# Altium footprint library Ports2.54.PcbLib: 152 footprints (part 7 of 10)
Each footprint in its own frame and in the unit in brackets; x right, y up, seen from the top. Pads: shape width x height; smd on the part's side, far side on the other; paste and mask are expansions set on the pad; w line width, h text height; cw(c..) or ccw(c..) is an arc to the next point about the centre after c.
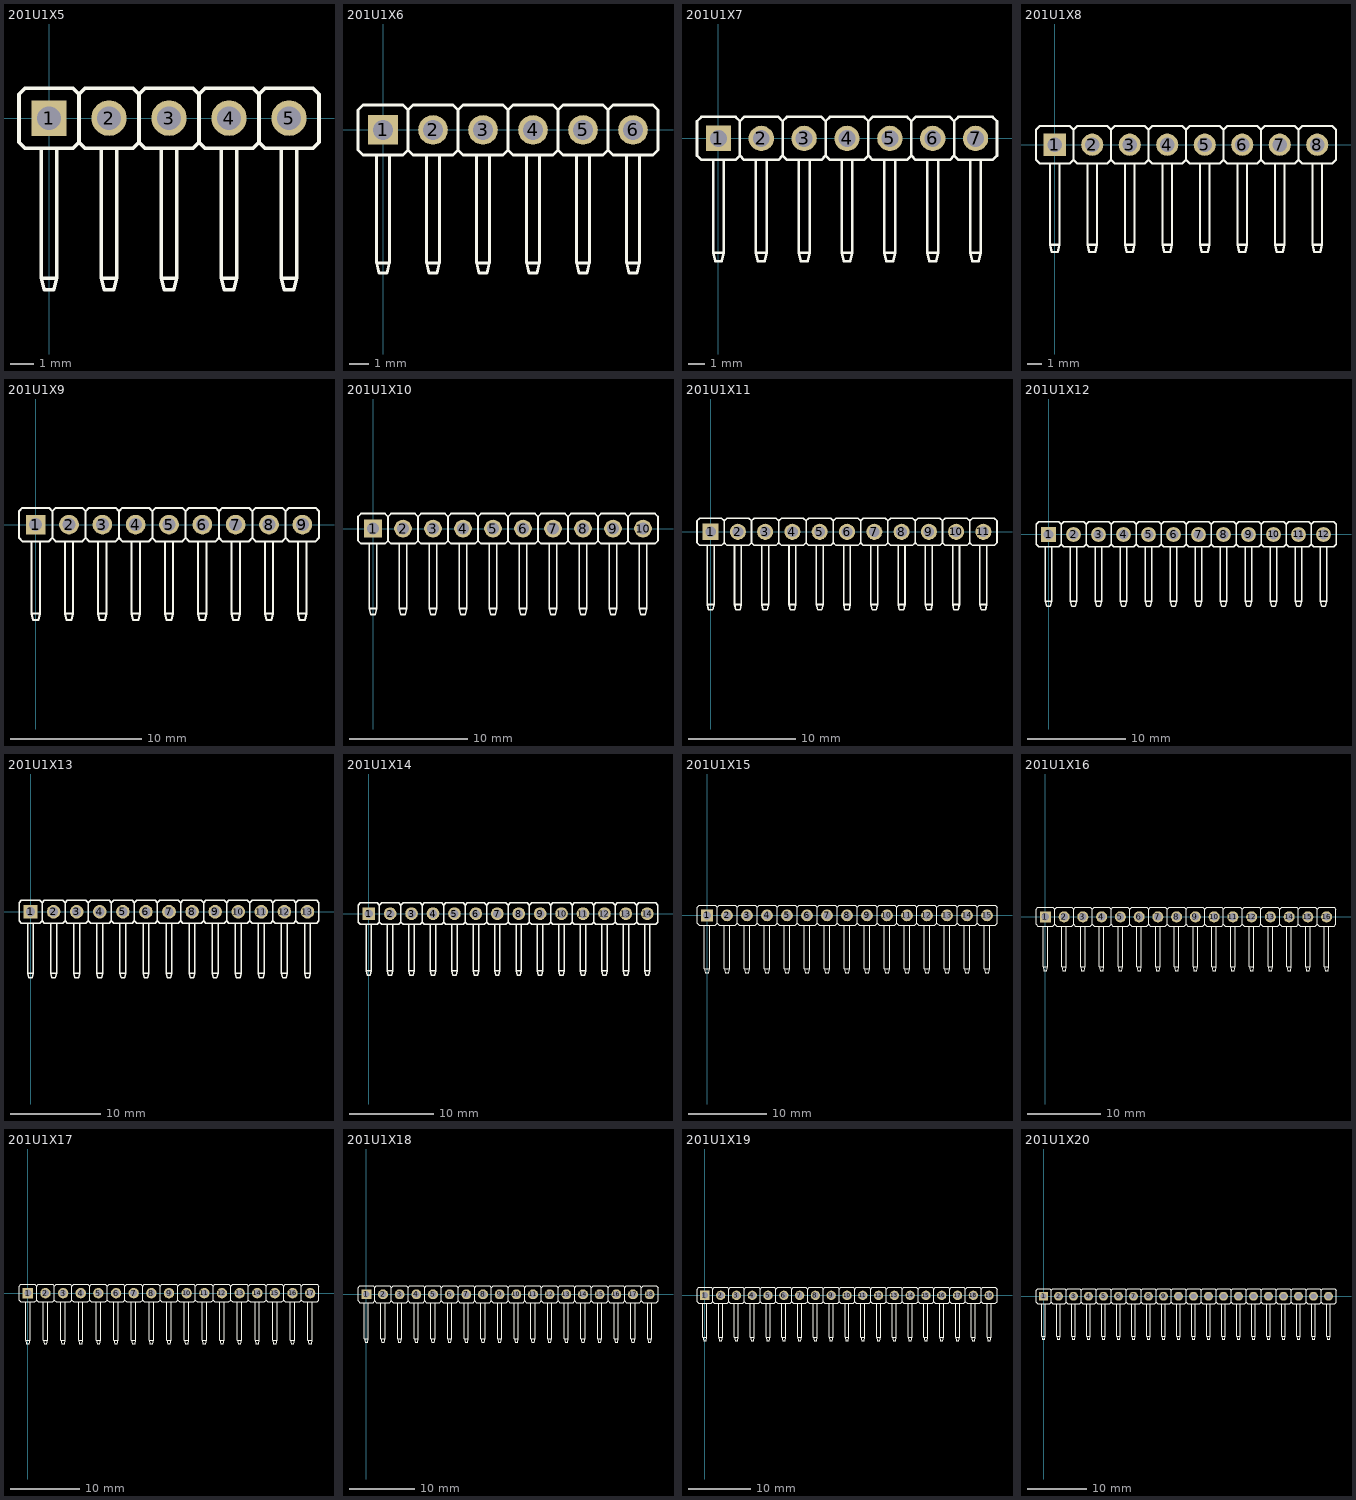
[diagram p6: the footprints below, top view; thin cyan lines are the x and y axes]

## 201U1X5 [mm]
pads (5):
  rect 1.5x1.5 hole 1: 1(0,0)
  round 1.5 hole 1: 2(2.54,0) 3(5.08,0) 4(7.62,0) 5(10.16,0)
Top Overlay:
  lines w0.15: -0.32,-1.28 -0.32,-6.77 ; 0.32,-1.28 0.32,-6.77 ; 2.22,-1.28 2.22,-6.77 ; 2.86,-1.28 2.86,-6.77 ; 4.76,-1.28 4.76,-6.77 ; 5.4,-1.28 5.4,-6.77 ; 7.3,-1.28 7.3,-6.77 ; 7.94,-1.28 7.94,-6.77 ; 9.84,-1.28 9.84,-6.77 ; 10.48,-1.28 10.48,-6.77 ; -0.32,-6.77 -0.2,-7.27 0.2,-7.27 0.32,-6.77 ; -0.32,-6.77 0.32,-6.77 ; 1.27,-1.016 1.524,-1.27 3.556,-1.27 3.81,-1.016 ; 1.27,-1.016 1.27,1.016 ; 1.27,-1.016 1.016,-1.27 -1.016,-1.27 -1.27,-1.016 -1.27,1.016 -1.016,1.27 1.016,1.27 1.27,1.016 ; 1.27,1.016 1.524,1.27 3.556,1.27 3.81,1.016 ; 2.22,-6.77 2.86,-6.77 ; 2.22,-6.77 2.34,-7.27 2.74,-7.27 2.86,-6.77 ; 3.81,-1.016 3.81,1.016 ; 3.81,-1.016 4.064,-1.27 6.096,-1.27 6.35,-1.016 ; 3.81,1.016 4.064,1.27 6.096,1.27 6.35,1.016 ; 4.76,-6.77 4.88,-7.27 5.28,-7.27 5.4,-6.77 ; 4.76,-6.77 5.4,-6.77 ; 6.35,-1.016 6.35,1.016 ; 6.35,-1.016 6.604,-1.27 8.636,-1.27 8.89,-1.016 ; 6.35,1.016 6.604,1.27 8.636,1.27 8.89,1.016 ; 7.3,-6.77 7.42,-7.27 7.82,-7.27 7.94,-6.77 ; 7.3,-6.77 7.94,-6.77 ; 8.89,-1.016 8.89,1.016 ; 8.89,-1.016 9.144,-1.27 11.176,-1.27 11.43,-1.016 11.43,1.016 11.176,1.27 9.144,1.27 8.89,1.016 ; 9.84,-6.77 10.48,-6.77 ; 9.84,-6.77 9.96,-7.27 10.36,-7.27 10.48,-6.77
3D body "201U5.STEP": height 5.12, standoff -3, extent -1.27,-7.27 11.43,1.27

## 201U1X6 [mm]
pads (6):
  rect 1.5x1.5 hole 1: 1(0,0)
  round 1.5 hole 1: 2(2.54,0) 3(5.08,0) 4(7.62,0) 5(10.16,0) 6(12.7,0)
Top Overlay:
  lines w0.15: -0.32,-1.28 -0.32,-6.77 ; 0.32,-1.28 0.32,-6.77 ; 2.22,-1.28 2.22,-6.77 ; 2.86,-1.28 2.86,-6.77 ; 4.76,-1.28 4.76,-6.77 ; 5.4,-1.28 5.4,-6.77 ; 7.3,-1.28 7.3,-6.77 ; 7.94,-1.28 7.94,-6.77 ; 9.84,-1.28 9.84,-6.77 ; 10.48,-1.28 10.48,-6.77 ; 12.38,-1.28 12.38,-6.77 ; 13.02,-1.28 13.02,-6.77 ; -0.32,-6.77 0.32,-6.77 ; -0.32,-6.77 -0.2,-7.27 0.2,-7.27 0.32,-6.77 ; 1.27,-1.016 1.016,-1.27 -1.016,-1.27 -1.27,-1.016 -1.27,1.016 -1.016,1.27 1.016,1.27 1.27,1.016 ; 1.27,-1.016 1.27,1.016 ; 1.27,-1.016 1.524,-1.27 3.556,-1.27 3.81,-1.016 ; 1.27,1.016 1.524,1.27 3.556,1.27 3.81,1.016 ; 2.22,-6.77 2.34,-7.27 2.74,-7.27 2.86,-6.77 ; 2.22,-6.77 2.86,-6.77 ; 3.81,-1.016 4.064,-1.27 6.096,-1.27 6.35,-1.016 ; 3.81,-1.016 3.81,1.016 ; 3.81,1.016 4.064,1.27 6.096,1.27 6.35,1.016 ; 4.76,-6.77 5.4,-6.77 ; 4.76,-6.77 4.88,-7.27 5.28,-7.27 5.4,-6.77 ; 6.35,-1.016 6.604,-1.27 8.636,-1.27 8.89,-1.016 ; 6.35,-1.016 6.35,1.016 ; 6.35,1.016 6.604,1.27 8.636,1.27 8.89,1.016 ; 7.3,-6.77 7.94,-6.77 ; 7.3,-6.77 7.42,-7.27 7.82,-7.27 7.94,-6.77 ; 8.89,-1.016 9.144,-1.27 11.176,-1.27 11.43,-1.016 ; 8.89,-1.016 8.89,1.016 ; 8.89,1.016 9.144,1.27 11.176,1.27 11.43,1.016 ; 9.84,-6.77 9.96,-7.27 10.36,-7.27 10.48,-6.77 ; 9.84,-6.77 10.48,-6.77 ; 11.43,-1.016 11.684,-1.27 13.716,-1.27 13.97,-1.016 13.97,1.016 13.716,1.27 11.684,1.27 11.43,1.016 ; 11.43,-1.016 11.43,1.016 ; 12.38,-6.77 13.02,-6.77 ; 12.38,-6.77 12.5,-7.27 12.9,-7.27 13.02,-6.77
3D body "201U6.STEP": height 5.12, standoff -3, extent -1.27,-7.27 13.97,1.27

## 201U1X7 [mm]
pads (7):
  rect 1.5x1.5 hole 1: 1(0,0)
  round 1.5 hole 1: 2(2.54,0) 3(5.08,0) 4(7.62,0) 5(10.16,0) 6(12.7,0) 7(15.24,0)
Top Overlay:
  lines w0.15: -0.32,-1.28 -0.32,-6.77 ; 0.32,-1.28 0.32,-6.77 ; 2.22,-1.28 2.22,-6.77 ; 2.86,-1.28 2.86,-6.77 ; 4.76,-1.28 4.76,-6.77 ; 5.4,-1.28 5.4,-6.77 ; 7.3,-1.28 7.3,-6.77 ; 7.94,-1.28 7.94,-6.77 ; 9.84,-1.28 9.84,-6.77 ; 10.48,-1.28 10.48,-6.77 ; 12.38,-1.28 12.38,-6.77 ; 13.02,-1.28 13.02,-6.77 ; 14.92,-1.28 14.92,-6.77 ; 15.56,-1.28 15.56,-6.77 ; -0.32,-6.77 0.32,-6.77 ; -0.32,-6.77 -0.2,-7.27 0.2,-7.27 0.32,-6.77 ; 1.27,-1.016 1.016,-1.27 -1.016,-1.27 -1.27,-1.016 -1.27,1.016 -1.016,1.27 1.016,1.27 1.27,1.016 ; 1.27,-1.016 1.27,1.016 ; 1.27,-1.016 1.524,-1.27 3.556,-1.27 3.81,-1.016 ; 1.27,1.016 1.524,1.27 3.556,1.27 3.81,1.016 ; 2.22,-6.77 2.34,-7.27 2.74,-7.27 2.86,-6.77 ; 2.22,-6.77 2.86,-6.77 ; 3.81,-1.016 4.064,-1.27 6.096,-1.27 6.35,-1.016 ; 3.81,-1.016 3.81,1.016 ; 3.81,1.016 4.064,1.27 6.096,1.27 6.35,1.016 ; 4.76,-6.77 5.4,-6.77 ; 4.76,-6.77 4.88,-7.27 5.28,-7.27 5.4,-6.77 ; 6.35,-1.016 6.604,-1.27 8.636,-1.27 8.89,-1.016 ; 6.35,-1.016 6.35,1.016 ; 6.35,1.016 6.604,1.27 8.636,1.27 8.89,1.016 ; 7.3,-6.77 7.94,-6.77 ; 7.3,-6.77 7.42,-7.27 7.82,-7.27 7.94,-6.77 ; 8.89,-1.016 9.144,-1.27 11.176,-1.27 11.43,-1.016 ; 8.89,-1.016 8.89,1.016 ; 8.89,1.016 9.144,1.27 11.176,1.27 11.43,1.016 ; 9.84,-6.77 9.96,-7.27 10.36,-7.27 10.48,-6.77 ; 9.84,-6.77 10.48,-6.77 ; 11.43,-1.016 11.684,-1.27 13.716,-1.27 13.97,-1.016 ; 11.43,-1.016 11.43,1.016 ; 11.43,1.016 11.684,1.27 13.716,1.27 13.97,1.016 ; 12.38,-6.77 13.02,-6.77 ; 12.38,-6.77 12.5,-7.27 12.9,-7.27 13.02,-6.77 ; 13.97,-1.016 14.224,-1.27 16.256,-1.27 16.51,-1.016 16.51,1.016 16.256,1.27 14.224,1.27 13.97,1.016 ; 13.97,-1.016 13.97,1.016 ; 14.92,-6.77 15.04,-7.27 15.44,-7.27 15.56,-6.77 ; 14.92,-6.77 15.56,-6.77
3D body "201U7.STEP": height 5.12, standoff -3, extent -1.27,-7.27 16.51,1.27

## 201U1X8 [mm]
pads (8):
  rect 1.5x1.5 hole 1: 1(0,0)
  round 1.5 hole 1: 2(2.54,0) 3(5.08,0) 4(7.62,0) 5(10.16,0) 6(12.7,0) 7(15.24,0) 8(17.78,0)
Top Overlay:
  lines w0.15: -0.32,-1.28 -0.32,-6.77 ; 0.32,-1.28 0.32,-6.77 ; 2.22,-1.28 2.22,-6.77 ; 2.86,-1.28 2.86,-6.77 ; 4.76,-1.28 4.76,-6.77 ; 5.4,-1.28 5.4,-6.77 ; 7.3,-1.28 7.3,-6.77 ; 7.94,-1.28 7.94,-6.77 ; 9.84,-1.28 9.84,-6.77 ; 10.48,-1.28 10.48,-6.77 ; 12.38,-1.28 12.38,-6.77 ; 13.02,-1.28 13.02,-6.77 ; 14.92,-1.28 14.92,-6.77 ; 15.56,-1.28 15.56,-6.77 ; 17.46,-1.28 17.46,-6.77 ; 18.1,-1.28 18.1,-6.77 ; -0.32,-6.77 -0.2,-7.27 0.2,-7.27 0.32,-6.77 ; -0.32,-6.77 0.32,-6.77 ; 1.27,-1.016 1.524,-1.27 3.556,-1.27 3.81,-1.016 ; 1.27,-1.016 1.27,1.016 ; 1.27,-1.016 1.016,-1.27 -1.016,-1.27 -1.27,-1.016 -1.27,1.016 -1.016,1.27 1.016,1.27 1.27,1.016 ; 1.27,1.016 1.524,1.27 3.556,1.27 3.81,1.016 ; 2.22,-6.77 2.86,-6.77 ; 2.22,-6.77 2.34,-7.27 2.74,-7.27 2.86,-6.77 ; 3.81,-1.016 3.81,1.016 ; 3.81,-1.016 4.064,-1.27 6.096,-1.27 6.35,-1.016 ; 3.81,1.016 4.064,1.27 6.096,1.27 6.35,1.016 ; 4.76,-6.77 4.88,-7.27 5.28,-7.27 5.4,-6.77 ; 4.76,-6.77 5.4,-6.77 ; 6.35,-1.016 6.35,1.016 ; 6.35,-1.016 6.604,-1.27 8.636,-1.27 8.89,-1.016 ; 6.35,1.016 6.604,1.27 8.636,1.27 8.89,1.016 ; 7.3,-6.77 7.42,-7.27 7.82,-7.27 7.94,-6.77 ; 7.3,-6.77 7.94,-6.77 ; 8.89,-1.016 8.89,1.016 ; 8.89,-1.016 9.144,-1.27 11.176,-1.27 11.43,-1.016 ; 8.89,1.016 9.144,1.27 11.176,1.27 11.43,1.016 ; 9.84,-6.77 10.48,-6.77 ; 9.84,-6.77 9.96,-7.27 10.36,-7.27 10.48,-6.77 ; 11.43,-1.016 11.43,1.016 ; 11.43,-1.016 11.684,-1.27 13.716,-1.27 13.97,-1.016 ; 11.43,1.016 11.684,1.27 13.716,1.27 13.97,1.016 ; 12.38,-6.77 12.5,-7.27 12.9,-7.27 13.02,-6.77 ; 12.38,-6.77 13.02,-6.77 ; 13.97,-1.016 13.97,1.016 ; 13.97,-1.016 14.224,-1.27 16.256,-1.27 16.51,-1.016 ; 13.97,1.016 14.224,1.27 16.256,1.27 16.51,1.016 ; 14.92,-6.77 15.56,-6.77 ; 14.92,-6.77 15.04,-7.27 15.44,-7.27 15.56,-6.77 ; 16.51,-1.016 16.51,1.016 ; 16.51,-1.016 16.764,-1.27 18.796,-1.27 19.05,-1.016 19.05,1.016 18.796,1.27 16.764,1.27 16.51,1.016 ; 17.46,-6.77 17.58,-7.27 17.98,-7.27 18.1,-6.77 ; 17.46,-6.77 18.1,-6.77
3D body "201U8.STEP": height 5.12, standoff -3, extent -1.27,-7.27 19.05,1.27

## 201U1X9 [mm]
pads (9):
  rect 1.5x1.5 hole 1: 1(0,0)
  round 1.5 hole 1: 2(2.54,0) 3(5.08,0) 4(7.62,0) 5(10.16,0) 6(12.7,0) 7(15.24,0) 8(17.78,0) 9(20.32,0)
Top Overlay:
  lines w0.15: -0.32,-1.28 -0.32,-6.77 ; 0.32,-1.28 0.32,-6.77 ; 2.22,-1.28 2.22,-6.77 ; 2.86,-1.28 2.86,-6.77 ; 4.76,-1.28 4.76,-6.77 ; 5.4,-1.28 5.4,-6.77 ; 7.3,-1.28 7.3,-6.77 ; 7.94,-1.28 7.94,-6.77 ; 9.84,-1.28 9.84,-6.77 ; 10.48,-1.28 10.48,-6.77 ; 12.38,-1.28 12.38,-6.77 ; 13.02,-1.28 13.02,-6.77 ; 14.92,-1.28 14.92,-6.77 ; 15.56,-1.28 15.56,-6.77 ; 17.46,-1.28 17.46,-6.77 ; 18.1,-1.28 18.1,-6.77 ; 20,-1.28 20,-6.77 ; 20.64,-1.28 20.64,-6.77 ; -0.32,-6.77 -0.2,-7.27 0.2,-7.27 0.32,-6.77 ; -0.32,-6.77 0.32,-6.77 ; 1.27,-1.016 1.524,-1.27 3.556,-1.27 3.81,-1.016 ; 1.27,-1.016 1.27,1.016 ; 1.27,-1.016 1.016,-1.27 -1.016,-1.27 -1.27,-1.016 -1.27,1.016 -1.016,1.27 1.016,1.27 1.27,1.016 ; 1.27,1.016 1.524,1.27 3.556,1.27 3.81,1.016 ; 2.22,-6.77 2.86,-6.77 ; 2.22,-6.77 2.34,-7.27 2.74,-7.27 2.86,-6.77 ; 3.81,-1.016 3.81,1.016 ; 3.81,-1.016 4.064,-1.27 6.096,-1.27 6.35,-1.016 ; 3.81,1.016 4.064,1.27 6.096,1.27 6.35,1.016 ; 4.76,-6.77 4.88,-7.27 5.28,-7.27 5.4,-6.77 ; 4.76,-6.77 5.4,-6.77 ; 6.35,-1.016 6.35,1.016 ; 6.35,-1.016 6.604,-1.27 8.636,-1.27 8.89,-1.016 ; 6.35,1.016 6.604,1.27 8.636,1.27 8.89,1.016 ; 7.3,-6.77 7.42,-7.27 7.82,-7.27 7.94,-6.77 ; 7.3,-6.77 7.94,-6.77 ; 8.89,-1.016 8.89,1.016 ; 8.89,-1.016 9.144,-1.27 11.176,-1.27 11.43,-1.016 ; 8.89,1.016 9.144,1.27 11.176,1.27 11.43,1.016 ; 9.84,-6.77 10.48,-6.77 ; 9.84,-6.77 9.96,-7.27 10.36,-7.27 10.48,-6.77 ; 11.43,-1.016 11.43,1.016 ; 11.43,-1.016 11.684,-1.27 13.716,-1.27 13.97,-1.016 ; 11.43,1.016 11.684,1.27 13.716,1.27 13.97,1.016 ; 12.38,-6.77 12.5,-7.27 12.9,-7.27 13.02,-6.77 ; 12.38,-6.77 13.02,-6.77 ; 13.97,-1.016 13.97,1.016 ; 13.97,-1.016 14.224,-1.27 16.256,-1.27 16.51,-1.016 ; 13.97,1.016 14.224,1.27 16.256,1.27 16.51,1.016 ; 14.92,-6.77 15.56,-6.77 ; 14.92,-6.77 15.04,-7.27 15.44,-7.27 15.56,-6.77 ; 16.51,-1.016 16.51,1.016 ; 16.51,-1.016 16.764,-1.27 18.796,-1.27 19.05,-1.016 ; 16.51,1.016 16.764,1.27 18.796,1.27 19.05,1.016 ; 17.46,-6.77 17.58,-7.27 17.98,-7.27 18.1,-6.77 ; 17.46,-6.77 18.1,-6.77 ; 19.05,-1.016 19.05,1.016 ; 19.05,-1.016 19.304,-1.27 21.336,-1.27 21.59,-1.016 21.59,1.016 21.336,1.27 19.304,1.27 19.05,1.016 ; 20,-6.77 20.64,-6.77 ; 20,-6.77 20.12,-7.27 20.52,-7.27 20.64,-6.77
3D body "201U9.STEP": height 5.12, standoff -3, extent -1.27,-7.27 21.59,1.27

## 201U1X10 [mm]
pads (10):
  rect 1.5x1.5 hole 1: 1(0,0)
  round 1.5 hole 1: 2(2.54,0) 3(5.08,0) 4(7.62,0) 5(10.16,0) 6(12.7,0) 7(15.24,0) 8(17.78,0) 9(20.32,0) 10(22.86,0)
Top Overlay:
  lines w0.15: -0.32,-1.28 -0.32,-6.77 ; 0.32,-1.28 0.32,-6.77 ; 2.22,-1.28 2.22,-6.77 ; 2.86,-1.28 2.86,-6.77 ; 4.76,-1.28 4.76,-6.77 ; 5.4,-1.28 5.4,-6.77 ; 7.3,-1.28 7.3,-6.77 ; 7.94,-1.28 7.94,-6.77 ; 9.84,-1.28 9.84,-6.77 ; 10.48,-1.28 10.48,-6.77 ; 12.38,-1.28 12.38,-6.77 ; 13.02,-1.28 13.02,-6.77 ; 14.92,-1.28 14.92,-6.77 ; 15.56,-1.28 15.56,-6.77 ; 17.46,-1.28 17.46,-6.77 ; 18.1,-1.28 18.1,-6.77 ; 20,-1.28 20,-6.77 ; 20.64,-1.28 20.64,-6.77 ; 22.54,-1.28 22.54,-6.77 ; 23.18,-1.28 23.18,-6.77 ; -0.32,-6.77 -0.2,-7.27 0.2,-7.27 0.32,-6.77 ; -0.32,-6.77 0.32,-6.77 ; 1.27,-1.016 1.524,-1.27 3.556,-1.27 3.81,-1.016 ; 1.27,-1.016 1.27,1.016 ; 1.27,-1.016 1.016,-1.27 -1.016,-1.27 -1.27,-1.016 -1.27,1.016 -1.016,1.27 1.016,1.27 1.27,1.016 ; 1.27,1.016 1.524,1.27 3.556,1.27 3.81,1.016 ; 2.22,-6.77 2.86,-6.77 ; 2.22,-6.77 2.34,-7.27 2.74,-7.27 2.86,-6.77 ; 3.81,-1.016 3.81,1.016 ; 3.81,-1.016 4.064,-1.27 6.096,-1.27 6.35,-1.016 ; 3.81,1.016 4.064,1.27 6.096,1.27 6.35,1.016 ; 4.76,-6.77 4.88,-7.27 5.28,-7.27 5.4,-6.77 ; 4.76,-6.77 5.4,-6.77 ; 6.35,-1.016 6.35,1.016 ; 6.35,-1.016 6.604,-1.27 8.636,-1.27 8.89,-1.016 ; 6.35,1.016 6.604,1.27 8.636,1.27 8.89,1.016 ; 7.3,-6.77 7.42,-7.27 7.82,-7.27 7.94,-6.77 ; 7.3,-6.77 7.94,-6.77 ; 8.89,-1.016 8.89,1.016 ; 8.89,-1.016 9.144,-1.27 11.176,-1.27 11.43,-1.016 ; 8.89,1.016 9.144,1.27 11.176,1.27 11.43,1.016 ; 9.84,-6.77 10.48,-6.77 ; 9.84,-6.77 9.96,-7.27 10.36,-7.27 10.48,-6.77 ; 11.43,-1.016 11.43,1.016 ; 11.43,-1.016 11.684,-1.27 13.716,-1.27 13.97,-1.016 ; 11.43,1.016 11.684,1.27 13.716,1.27 13.97,1.016 ; 12.38,-6.77 12.5,-7.27 12.9,-7.27 13.02,-6.77 ; 12.38,-6.77 13.02,-6.77 ; 13.97,-1.016 13.97,1.016 ; 13.97,-1.016 14.224,-1.27 16.256,-1.27 16.51,-1.016 ; 13.97,1.016 14.224,1.27 16.256,1.27 16.51,1.016 ; 14.92,-6.77 15.56,-6.77 ; 14.92,-6.77 15.04,-7.27 15.44,-7.27 15.56,-6.77 ; 16.51,-1.016 16.51,1.016 ; 16.51,-1.016 16.764,-1.27 18.796,-1.27 19.05,-1.016 ; 16.51,1.016 16.764,1.27 18.796,1.27 19.05,1.016 ; 17.46,-6.77 17.58,-7.27 17.98,-7.27 18.1,-6.77 ; 17.46,-6.77 18.1,-6.77 ; 19.05,-1.016 19.05,1.016 ; 19.05,-1.016 19.304,-1.27 21.336,-1.27 21.59,-1.016 ; 19.05,1.016 19.304,1.27 21.336,1.27 21.59,1.016 ; 20,-6.77 20.64,-6.77 ; 20,-6.77 20.12,-7.27 20.52,-7.27 20.64,-6.77 ; 21.59,-1.016 21.59,1.016 ; 21.59,-1.016 21.844,-1.27 23.876,-1.27 24.13,-1.016 24.13,1.016 23.876,1.27 21.844,1.27 21.59,1.016 ; 22.54,-6.77 22.66,-7.27 23.06,-7.27 23.18,-6.77 ; 22.54,-6.77 23.18,-6.77
3D body "201U10.STEP": height 5.12, standoff -3, extent -1.27,-7.27 24.13,1.27

## 201U1X11 [mm]
pads (11):
  rect 1.5x1.5 hole 1: 1(0,0)
  round 1.5 hole 1: 2(2.54,0) 3(5.08,0) 4(7.62,0) 5(10.16,0) 6(12.7,0) 7(15.24,0) 8(17.78,0) 9(20.32,0) 10(22.86,0) 11(25.4,0)
Top Overlay:
  lines w0.15: -0.32,-1.28 -0.32,-6.77 ; 0.32,-1.28 0.32,-6.77 ; 2.22,-1.28 2.22,-6.77 ; 2.86,-1.28 2.86,-6.77 ; 4.76,-1.28 4.76,-6.77 ; 5.4,-1.28 5.4,-6.77 ; 7.3,-1.28 7.3,-6.77 ; 7.94,-1.28 7.94,-6.77 ; 9.84,-1.28 9.84,-6.77 ; 10.48,-1.28 10.48,-6.77 ; 12.38,-1.28 12.38,-6.77 ; 13.02,-1.28 13.02,-6.77 ; 14.92,-1.28 14.92,-6.77 ; 15.56,-1.28 15.56,-6.77 ; 17.46,-1.28 17.46,-6.77 ; 18.1,-1.28 18.1,-6.77 ; 20,-1.28 20,-6.77 ; 20.64,-1.28 20.64,-6.77 ; 22.54,-1.28 22.54,-6.77 ; 23.18,-1.28 23.18,-6.77 ; 25.08,-1.28 25.08,-6.77 ; 25.72,-1.28 25.72,-6.77 ; -0.32,-6.77 -0.2,-7.27 0.2,-7.27 0.32,-6.77 ; -0.32,-6.77 0.32,-6.77 ; 1.27,-1.016 1.524,-1.27 3.556,-1.27 3.81,-1.016 ; 1.27,-1.016 1.27,1.016 ; 1.27,-1.016 1.016,-1.27 -1.016,-1.27 -1.27,-1.016 -1.27,1.016 -1.016,1.27 1.016,1.27 1.27,1.016 ; 1.27,1.016 1.524,1.27 3.556,1.27 3.81,1.016 ; 2.22,-6.77 2.86,-6.77 ; 2.22,-6.77 2.34,-7.27 2.74,-7.27 2.86,-6.77 ; 3.81,-1.016 3.81,1.016 ; 3.81,-1.016 4.064,-1.27 6.096,-1.27 6.35,-1.016 ; 3.81,1.016 4.064,1.27 6.096,1.27 6.35,1.016 ; 4.76,-6.77 4.88,-7.27 5.28,-7.27 5.4,-6.77 ; 4.76,-6.77 5.4,-6.77 ; 6.35,-1.016 6.35,1.016 ; 6.35,-1.016 6.604,-1.27 8.636,-1.27 8.89,-1.016 ; 6.35,1.016 6.604,1.27 8.636,1.27 8.89,1.016 ; 7.3,-6.77 7.42,-7.27 7.82,-7.27 7.94,-6.77 ; 7.3,-6.77 7.94,-6.77 ; 8.89,-1.016 8.89,1.016 ; 8.89,-1.016 9.144,-1.27 11.176,-1.27 11.43,-1.016 ; 8.89,1.016 9.144,1.27 11.176,1.27 11.43,1.016 ; 9.84,-6.77 10.48,-6.77 ; 9.84,-6.77 9.96,-7.27 10.36,-7.27 10.48,-6.77 ; 11.43,-1.016 11.43,1.016 ; 11.43,-1.016 11.684,-1.27 13.716,-1.27 13.97,-1.016 ; 11.43,1.016 11.684,1.27 13.716,1.27 13.97,1.016 ; 12.38,-6.77 12.5,-7.27 12.9,-7.27 13.02,-6.77 ; 12.38,-6.77 13.02,-6.77 ; 13.97,-1.016 13.97,1.016 ; 13.97,-1.016 14.224,-1.27 16.256,-1.27 16.51,-1.016 ; 13.97,1.016 14.224,1.27 16.256,1.27 16.51,1.016 ; 14.92,-6.77 15.56,-6.77 ; 14.92,-6.77 15.04,-7.27 15.44,-7.27 15.56,-6.77 ; 16.51,-1.016 16.51,1.016 ; 16.51,-1.016 16.764,-1.27 18.796,-1.27 19.05,-1.016 ; 16.51,1.016 16.764,1.27 18.796,1.27 19.05,1.016 ; 17.46,-6.77 17.58,-7.27 17.98,-7.27 18.1,-6.77 ; 17.46,-6.77 18.1,-6.77 ; 19.05,-1.016 19.05,1.016 ; 19.05,-1.016 19.304,-1.27 21.336,-1.27 21.59,-1.016 ; 19.05,1.016 19.304,1.27 21.336,1.27 21.59,1.016 ; 20,-6.77 20.64,-6.77 ; 20,-6.77 20.12,-7.27 20.52,-7.27 20.64,-6.77 ; 21.59,-1.016 21.59,1.016 ; 21.59,-1.016 21.844,-1.27 23.876,-1.27 24.13,-1.016 ; 21.59,1.016 21.844,1.27 23.876,1.27 24.13,1.016 ; 22.54,-6.77 22.66,-7.27 23.06,-7.27 23.18,-6.77 ; 22.54,-6.77 23.18,-6.77 ; 24.13,-1.016 24.13,1.016 ; 24.13,-1.016 24.384,-1.27 26.416,-1.27 26.67,-1.016 26.67,1.016 26.416,1.27 24.384,1.27 24.13,1.016 ; 25.08,-6.77 25.72,-6.77 ; 25.08,-6.77 25.2,-7.27 25.6,-7.27 25.72,-6.77
3D body "201U11.STEP": height 5.12, standoff -3, extent -1.27,-7.27 26.67,1.27

## 201U1X12 [mm]
pads (12):
  rect 1.5x1.5 hole 1: 1(0,0)
  round 1.5 hole 1: 2(2.54,0) 3(5.08,0) 4(7.62,0) 5(10.16,0) 6(12.7,0) 7(15.24,0) 8(17.78,0) 9(20.32,0) 10(22.86,0) 11(25.4,0) 12(27.94,0)
Top Overlay:
  drawing of 157 lines, arcs and shapes, not listed
3D body "201U12.STEP": height 5.12, standoff -3, extent -1.27,-7.27 29.21,1.27

## 201U1X13 [mm]
pads (13):
  rect 1.5x1.5 hole 1: 1(0,0)
  round 1.5 hole 1: 2(2.54,0) 3(5.08,0) 4(7.62,0) 5(10.16,0) 6(12.7,0) 7(15.24,0) 8(17.78,0) 9(20.32,0) 10(22.86,0) 11(25.4,0) 12(27.94,0) 13(30.48,0)
Top Overlay:
  drawing of 170 lines, arcs and shapes, not listed
3D body "201U13.STEP": height 5.12, standoff -3, extent -1.27,-7.27 31.75,1.27

## 201U1X14 [mm]
pads (14):
  rect 1.5x1.5 hole 1: 1(0,0)
  round 1.5 hole 1: 2(2.54,0) 3(5.08,0) 4(7.62,0) 5(10.16,0) 6(12.7,0) 7(15.24,0) 8(17.78,0) 9(20.32,0) 10(22.86,0) 11(25.4,0) 12(27.94,0) 13(30.48,0) 14(33.02,0)
Top Overlay:
  drawing of 183 lines, arcs and shapes, not listed
3D body "201U14.STEP": height 5.12, standoff -3, extent -1.27,-7.27 34.29,1.27

## 201U1X15 [mm]
pads (15):
  rect 1.5x1.5 hole 1: 1(0,0)
  round 1.5 hole 1: 2(2.54,0) 3(5.08,0) 4(7.62,0) 5(10.16,0) 6(12.7,0) 7(15.24,0) 8(17.78,0) 9(20.32,0) 10(22.86,0) 11(25.4,0) 12(27.94,0) 13(30.48,0) 14(33.02,0) 15(35.56,0)
Top Overlay:
  drawing of 196 lines, arcs and shapes, not listed
3D body "201U15.STEP": height 5.12, standoff -3, extent -1.27,-7.27 36.83,1.27

## 201U1X16 [mm]
pads (16):
  rect 1.5x1.5 hole 1: 1(0,0)
  round 1.5 hole 1: 2(2.54,0) 3(5.08,0) 4(7.62,0) 5(10.16,0) 6(12.7,0) 7(15.24,0) 8(17.78,0) 9(20.32,0) 10(22.86,0) 11(25.4,0) 12(27.94,0) 13(30.48,0) 14(33.02,0) 15(35.56,0) 16(38.1,0)
Top Overlay:
  drawing of 209 lines, arcs and shapes, not listed
3D body "201U16.STEP": height 5.12, standoff -3, extent -1.27,-7.27 39.37,1.27

## 201U1X17 [mm]
pads (17):
  rect 1.5x1.5 hole 1: 1(0,0)
  round 1.5 hole 1: 2(2.54,0) 3(5.08,0) 4(7.62,0) 5(10.16,0) 6(12.7,0) 7(15.24,0) 8(17.78,0) 9(20.32,0) 10(22.86,0) 11(25.4,0) 12(27.94,0) 13(30.48,0) 14(33.02,0) 15(35.56,0) 16(38.1,0) 17(40.64,0)
Top Overlay:
  drawing of 222 lines, arcs and shapes, not listed
3D body "201U17.STEP": height 5.12, standoff -3, extent -1.27,-7.27 41.91,1.27

## 201U1X18 [mm]
pads (18):
  rect 1.5x1.5 hole 1: 1(0,0)
  round 1.5 hole 1: 2(2.54,0) 3(5.08,0) 4(7.62,0) 5(10.16,0) 6(12.7,0) 7(15.24,0) 8(17.78,0) 9(20.32,0) 10(22.86,0) 11(25.4,0) 12(27.94,0) 13(30.48,0) 14(33.02,0) 15(35.56,0) 16(38.1,0) 17(40.64,0) 18(43.18,0)
Top Overlay:
  drawing of 235 lines, arcs and shapes, not listed
3D body "201U18.STEP": height 5.12, standoff -3, extent -1.27,-7.27 44.45,1.27

## 201U1X19 [mm]
pads (19):
  rect 1.5x1.5 hole 1: 1(0,0)
  round 1.5 hole 1: 2(2.54,0) 3(5.08,0) 4(7.62,0) 5(10.16,0) 6(12.7,0) 7(15.24,0) 8(17.78,0) 9(20.32,0) 10(22.86,0) 11(25.4,0) 12(27.94,0) 13(30.48,0) 14(33.02,0) 15(35.56,0) 16(38.1,0) 17(40.64,0) 18(43.18,0) 19(45.72,0)
Top Overlay:
  drawing of 248 lines, arcs and shapes, not listed
3D body "201U19.STEP": height 5.12, standoff -3, extent -1.27,-7.27 46.99,1.27

## 201U1X20 [mm]
pads (20):
  rect 1.5x1.5 hole 1: 1(0,0)
  round 1.5 hole 1: 2(2.54,0) 3(5.08,0) 4(7.62,0) 5(10.16,0) 6(12.7,0) 7(15.24,0) 8(17.78,0) 9(20.32,0) 10(22.86,0) 11(25.4,0) 12(27.94,0) 13(30.48,0) 14(33.02,0) 15(35.56,0) 16(38.1,0) 17(40.64,0) 18(43.18,0) 19(45.72,0) 20(48.26,0)
Top Overlay:
  drawing of 261 lines, arcs and shapes, not listed
3D body "201U20.STEP": height 5.12, standoff -3, extent -1.27,-7.27 49.53,1.27